# Altium footprint library General.PcbLib: 446 footprints (part 23 of 28)
Each footprint in its own frame and in the unit in brackets; x right, y up, seen from the top. Pads: shape width x height; smd on the part's side, far side on the other; paste and mask are expansions set on the pad; w line width, h text height; cw(c..) or ccw(c..) is an arc to the next point about the centre after c.
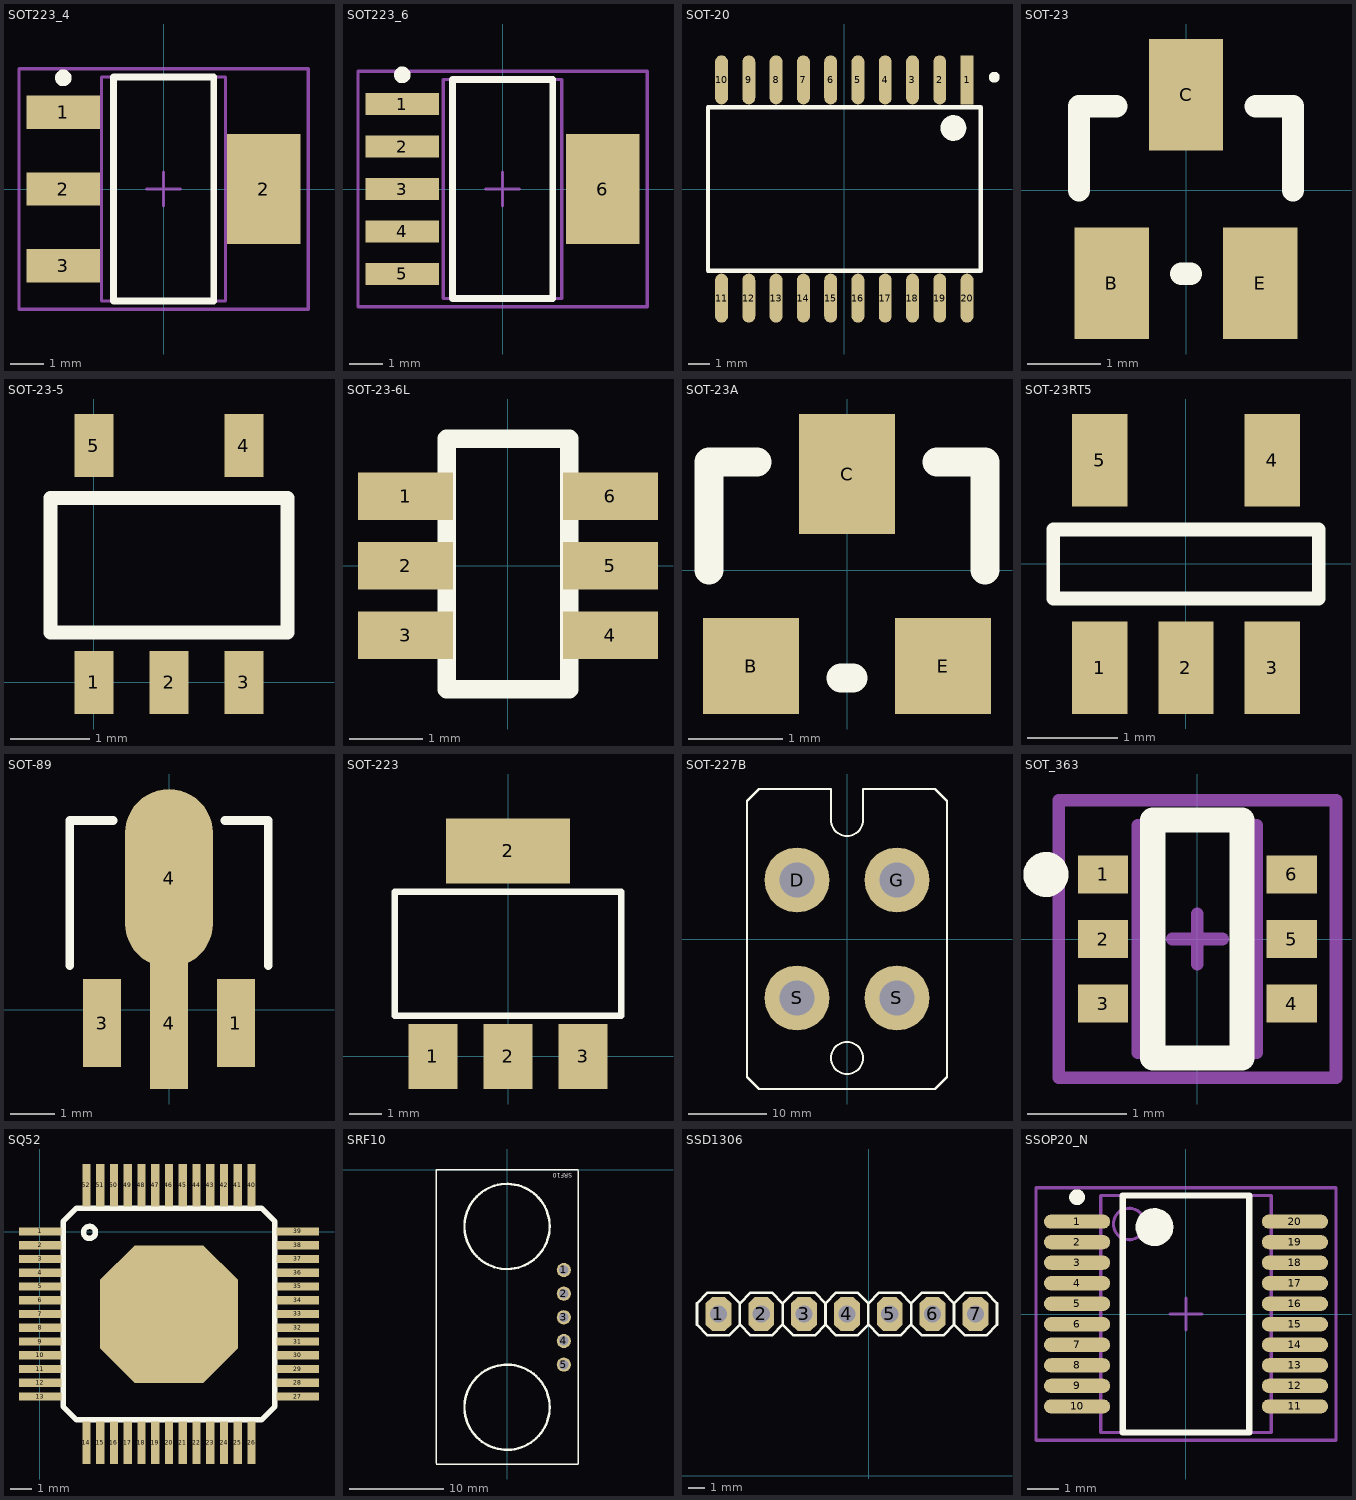
[diagram p22: the footprints below, top view; thin cyan lines are the x and y axes]

## SOT223_4 [mm] "SOT223, 4-Leads, Body 6.7x7.3mm (max), Pitch 2.30mm, IPC Medium Density"
height 1.7
pads (4):
  rect 2.2x1 smd: 1(-3,2.3) 2(-3,0) 3(-3,-2.3)
  rect 2.2x3.3 smd: 2(3,0)
Top Overlay:
  circle w0.25: c-3,3.325 r0.125
  lines w0.2: -1.5,-3.35 1.5,-3.35 1.5,3.35 -1.5,3.35 -1.5,-3.35
Mechanical 13:
  lines w0.1: -1.855,-3.35 1.855,-3.35 1.855,3.35 -1.855,3.35 -1.855,-3.35
Mechanical 15:
  lines w0.1: -0.5,0 0.5,0 ; 0,-0.5 0,0.5 ; -4.325,-3.6 4.325,-3.6 4.325,3.6 -4.325,3.6 -4.325,-3.6
3D body "SW3dPS-SOT-223-1.STEP": height 1.65, standoff 0, extent -3.449,-3.226 3.551,3.274

## SOT223_6 [mm] "SOT223, 6-Leads, Body 6.6x7.3mm (max), Pitch 1.27mm, IPC Medium Density"
height 1.7
pads (6):
  rect 2.2x0.65 smd: 1(-3,2.54) 2(-3,1.27) 3(-3,0) 4(-3,-1.27) 5(-3,-2.54)
  rect 2.2x3.3 smd: 6(3,0)
Top Overlay:
  circle w0.25: c-3,3.415 r0.125
  lines w0.2: -1.5,-3.275 1.5,-3.275 1.5,3.275 -1.5,3.275 -1.5,-3.275
Mechanical 13:
  lines w0.1: -1.775,-3.275 1.775,-3.275 1.775,3.275 -1.775,3.275 -1.775,-3.275
Mechanical 15:
  lines w0.1: -0.5,0 0.5,0 ; 0,-0.5 0,0.5 ; -4.325,-3.525 4.325,-3.525 4.325,3.525 -4.325,3.525 -4.325,-3.525
3D body: height 1.7, standoff 0.15, extent -1.775,-3.275 1.775,3.275

## SOT-20 [mm]
pads (20):
  rect 0.6x2.286 smd: 1(5.715,5.08)
  oval 0.6x2.286 smd: 2(4.445,5.08) 3(3.175,5.08) 4(1.905,5.08) 5(0.635,5.08) 6(-0.635,5.08) 7(-1.905,5.08) 8(-3.175,5.08) 9(-4.445,5.08) 10(-5.715,5.08) 11(-5.715,-5.08) 12(-4.445,-5.08) 13(-3.175,-5.08) 14(-1.905,-5.08) 15(-0.635,-5.08) 16(0.635,-5.08) 17(1.905,-5.08) 18(3.175,-5.08) 19(4.445,-5.08) 20(5.715,-5.08)
Top Overlay:
  circle w0.25: c6.985,5.205 r0.125
  circle w0.6: c5.08,2.84 r0.3
  lines w0.2: -6.35,-3.81 6.35,-3.81 6.35,3.81 -6.35,3.81 -6.35,-3.81
3D body: height 1.5, standoff 0.01, extent -6.35,-3.81 6.35,3.81

## SOT-23 [mil]
pads (3):
  rect 40x60 smd: B(-40,-50) C(0,51.18) E(40,-50)
Top Overlay:
  lines w12: -57.5,0 -57.5,45 -37.5,45 ; -2.5,-45 2.5,-45 ; 37.5,45 57.5,45 57.5,0
3D body "User Library-SOT-23-2.STEP": height 43, standoff 0.48, extent -59.87,-46.64 58.24,57.3

## SOT-23-5 [mm] "big num"
pads (5):
  rect 0.5x0.8 smd: 1(0,0) 2(0.95,0) 3(1.9,0) 4(1.9,3) 5(0,3)
Top Overlay:
  lines w0.178: -0.55,0.635 -0.55,2.335 2.45,2.335 2.45,0.635 -0.55,0.635

## SOT-23-6L [mm]
pads (6):
  rect 1.3x0.65 smd: 1(-1.4,0.95) 2(-1.4,0) 3(-1.4,-0.95) 4(1.4,-0.95) 5(1.4,0) 6(1.4,0.95)
Top Overlay:
  lines w0.254: -0.838,-1.69 0.836,-1.69 0.836,1.733 -0.838,1.733 -0.838,-1.69
3D body: height 1, standoff 0, extent -0.837,-1.679 0.832,1.717

## SOT-23A [mil]
pads (3):
  rect 40x40 smd: B(-40,-40) E(40,-40)
  rect 40x50 smd: C(0,40)
Top Overlay:
  lines w12: -57.5,0 -57.5,45 -37.5,45 ; -2.5,-45 2.5,-45 ; 37.5,45 57.5,45 57.5,0
3D body "User Library-sot23-1_.STEP": height 39.97, standoff 0.6, extent -56.48,-46.06 58.49,46.07

## SOT-23RT5 [mil]
pads (5):
  rect 24x40 smd: 1(-37.4,-45) 2(0,-45) 3(37.4,-45) 4(37.4,45) 5(-37.4,45)
Top Overlay:
  lines w6: -57.5,-15 57.5,-15 57.5,15 -57.5,15 -57.5,-15

## SOT-89 [mm]
pads (4):
  rect 0.864x2 smd: 1(1.524,-0.3) 3(-1.524,-0.3)
  rect 0.864x3 smd: 4(0,-0.3)
  oval 2x4.064 smd: 4(0,3)
Top Overlay:
  lines w0.203: -2.261,1.016 -2.261,4.318 -1.27,4.318 ; 1.27,4.318 2.261,4.318 2.261,1.016
3D body "SOT-89.step": height 1.51, standoff 0, extent -2.239,-0.296 2.261,4.004

## SOT-223 [mm]
height 1.75
pads (4):
  rect 1.5x2 smd: 1(-2.3,0) 2(0,0) 3(2.3,0)
  rect 3.8x2 smd: 2(0,6.3)
Top Overlay:
  lines w0.2: -3.474,1.248 3.474,1.248 3.474,5.054 -3.474,5.054 -3.474,1.248
3D body "User Library-SOT-223-2.STEP": height 1.82, standoff -0.08, extent -3.351,-0.388 3.349,6.816

## SOT-227B [mm]
pads (4):
  round 8.255 / inner round 8.255 / far side rect 11.43x8.255 hole 4.5: D(-6.35,7.493) G(6.35,7.493) S(-6.35,-7.493) S(6.35,-7.493)
Top Overlay:
  circle w0.254: c0,-15.113 r2.032
  lines w0.254: -12.7,-17.526 -11.176,-19.05 11.176,-19.05 12.7,-17.526 12.7,17.526 11.176,19.05 2.032,19.05 2.032,15.113 cw(c0,15.113) -2.032,15.113 -2.032,19.05 -11.176,19.05 -12.7,17.526 -12.7,-17.526

## SOT_363 [mil] "SOT363, 6-Leads, Body 2.8x2.8mm (max), Pitch 0.65mm, IPC Medium Density"
height 39.37
pads (6):
  rect 20x15 smd: 1(-37.4,25.59) 2(-37.4,0) 3(-37.4,-25.59) 4(37.4,-25.59) 5(37.4,0) 6(37.4,25.59)
Top Overlay:
  circle w10: c-60.04,25.59 r3.94
  lines w10: -17.72,-47.24 -17.72,47.24 17.72,47.24 17.72,-47.24 -17.72,-47.24
Mechanical 13:
  lines w5: -23.62,-45 -23.62,45 23.62,45 23.62,-45 -23.62,-45
Mechanical 15:
  lines w5: -10,0 10,0 ; 0,-10 0,10 ; -55,-55 -55,55 55,55 55,-55 -55,-55
3D body: height 39.37, standoff 0, extent -23.62,-45 23.62,45

## SQ52 [mm]
height 4.57
pads (53):
  rect 2x0.38 smd: 1(0.029,0.001) 2(0.029,-0.649) 3(0.029,-1.299) 4(0.029,-1.949) 5(0.029,-2.599) 6(0.029,-3.249) 7(0.029,-3.899) 8(0.029,-4.549) 9(0.029,-5.199) 10(0.029,-5.849) 11(0.029,-6.499) 12(0.029,-7.149) 13(0.029,-7.799) 27(12.208,-7.799) 28(12.208,-7.149) 29(12.208,-6.499) 30(12.208,-5.849) 31(12.208,-5.199) 32(12.208,-4.549) 33(12.208,-3.899) 34(12.208,-3.249) 35(12.208,-2.599) 36(12.208,-1.949) 37(12.208,-1.299) 38(12.208,-0.649) 39(12.208,0.001)
  rect 0.38x2 smd: 14(2.218,-9.989) 15(2.868,-9.989) 16(3.519,-9.989) 17(4.169,-9.989) 18(4.819,-9.989) 19(5.469,-9.989) 20(6.119,-9.989) 21(6.769,-9.989) 22(7.419,-9.989) 23(8.069,-9.989) 24(8.719,-9.989) 25(9.369,-9.989) 26(10.019,-9.989) 40(10.018,2.191) 41(9.368,2.191) 42(8.718,2.191) 43(8.068,2.191) 44(7.418,2.191) 45(6.768,2.191) 46(6.118,2.191) 47(5.468,2.191) 48(4.818,2.191) 49(4.168,2.191) 50(3.518,2.191) 51(2.868,2.191) 52(2.218,2.191)
  oct 6.5x6.5 smd: ""(6.118,-3.905)
Top Overlay:
  circle w0.254: c2.359,-0.042 r0.284
  lines w0.254: 1.118,-8.264 1.118,0.466 1.753,1.101 10.483,1.101 11.118,0.466 11.118,-8.264 10.483,-8.899 1.753,-8.899 1.118,-8.264

## SRF10 [mm]
pads (5):
  round 1.5 hole 1: 1(6,-10.6) 2(6,-13.1) 3(6,-15.6) 4(6,-18.1) 5(6,-20.6)
Top Overlay:
  circle w0.254: c0,-25.1 r4.5
  circle w0.254: c0,-6 r4.5
  lines w0.15: -7.5,-31.1 7.5,-31.1 7.5,-0.1 ; -7.5,-31 -7.5,0 7.5,0
  text "SRF10" at 6.9,-0.2 h0.8
3D body: height 9, standoff 2, extent -4.464,-29.641 4.5,-20.659
3D body: height 9, standoff 2, extent -4.464,-10.491 4.5,-1.509
3D body: height 2, standoff 0.4, extent -7.45,-31.15 7.55,-0.05

## SSD1306 [mil]
pads (7):
  oct 60x80 hole 40: 1(-350.39,377.95) 2(-250.39,377.95) 3(-150.39,377.95) 4(-50.39,377.95) 5(49.61,377.95) 6(149.61,377.95) 7(250,377.95)
Top Overlay:
  rectangle: 139.61,367.95 159.61,387.95
  rectangle: -360.39,367.95 -340.39,387.95
  rectangle: -260.39,367.95 -240.39,387.95
  rectangle: -160.39,367.95 -140.39,387.95
  rectangle: -60.39,367.95 -40.39,387.95
  rectangle: 39.61,367.95 59.61,387.95
  rectangle: 240,367.95 260,387.95
  lines w6: -300.39,352.95 -275.39,327.95 -225.39,327.95 -200.39,352.95 ; -300.39,352.95 -325.39,327.95 -375.39,327.95 -400.39,352.95 -400.39,402.95 -375.39,427.95 -325.39,427.95 -300.39,402.95 ; -300.39,352.95 -300.39,402.95 ; -300.39,402.95 -275.39,427.95 -225.39,427.95 -200.39,402.95 ; -200.39,352.95 -200.39,402.95 ; -200.39,352.95 -175.39,327.95 -125.39,327.95 -100.39,352.95 ; -200.39,402.95 -175.39,427.95 -125.39,427.95 -100.39,402.95 ; -100.39,352.95 -75.39,327.95 -25.39,327.95 -0.39,352.95 ; -100.39,352.95 -100.39,402.95 ; -100.39,402.95 -75.39,427.95 -25.39,427.95 -0.39,402.95 ; -0.39,352.95 24.61,327.95 74.61,327.95 99.61,352.95 ; -0.39,352.95 -0.39,402.95 ; -0.39,402.95 24.61,427.95 74.61,427.95 99.61,402.95 ; 99.61,352.95 124.61,327.95 174.61,327.95 199.61,352.95 199.61,402.95 174.61,427.95 124.61,427.95 99.61,402.95 ; 99.61,352.95 99.61,402.95 ; 200,352.95 200,402.95 225,427.95 275,427.95 300,402.95 300,352.95 275,327.95 225,327.95 200,352.95
3D body "User Library-128x64I2COLEDDisplayAdafruit.STEP": height 451.69, standoff 24.69, extent -566.93,-624.41 484.25,472.44

## SSOP20_N [mm]
pads (20):
  oval 2.1x0.45 smd: 1(-3.45,2.925) 2(-3.45,2.275) 3(-3.45,1.625) 4(-3.45,0.975) 5(-3.45,0.325) 6(-3.45,-0.325) 7(-3.45,-0.975) 8(-3.45,-1.625) 9(-3.45,-2.275) 10(-3.45,-2.925) 11(3.45,-2.925) 12(3.45,-2.275) 13(3.45,-1.625) 14(3.45,-0.975) 15(3.45,-0.325) 16(3.45,0.325) 17(3.45,0.975) 18(3.45,1.625) 19(3.45,2.275) 20(3.45,2.925)
Top Overlay:
  circle w0.6: c-1,2.75 r0.3
  circle w0.25: c-3.45,3.7 r0.125
  lines w0.2: -2,-3.75 2,-3.75 2,3.75 -2,3.75 -2,-3.75
Mechanical 13:
  circle w0.1: c-1.8,2.85 r0.5
  lines w0.1: -2.7,-3.75 2.7,-3.75 2.7,3.75 -2.7,3.75 -2.7,-3.75
Mechanical 15:
  lines w0.1: -0.5,0 0.5,0 ; 0,-0.5 0,0.5 ; -4.75,-4 4.75,-4 4.75,4 -4.75,4 -4.75,-4
3D body: height 1.99, standoff 0, extent -2.699,-3.749 2.699,3.749
3D body: height 1.99, standoff 0, extent -2.7,-3.75 2.7,3.75